# Altium integrated library chipfc_altium_libs.IntLib: 266 symbols (part 3 of 3)
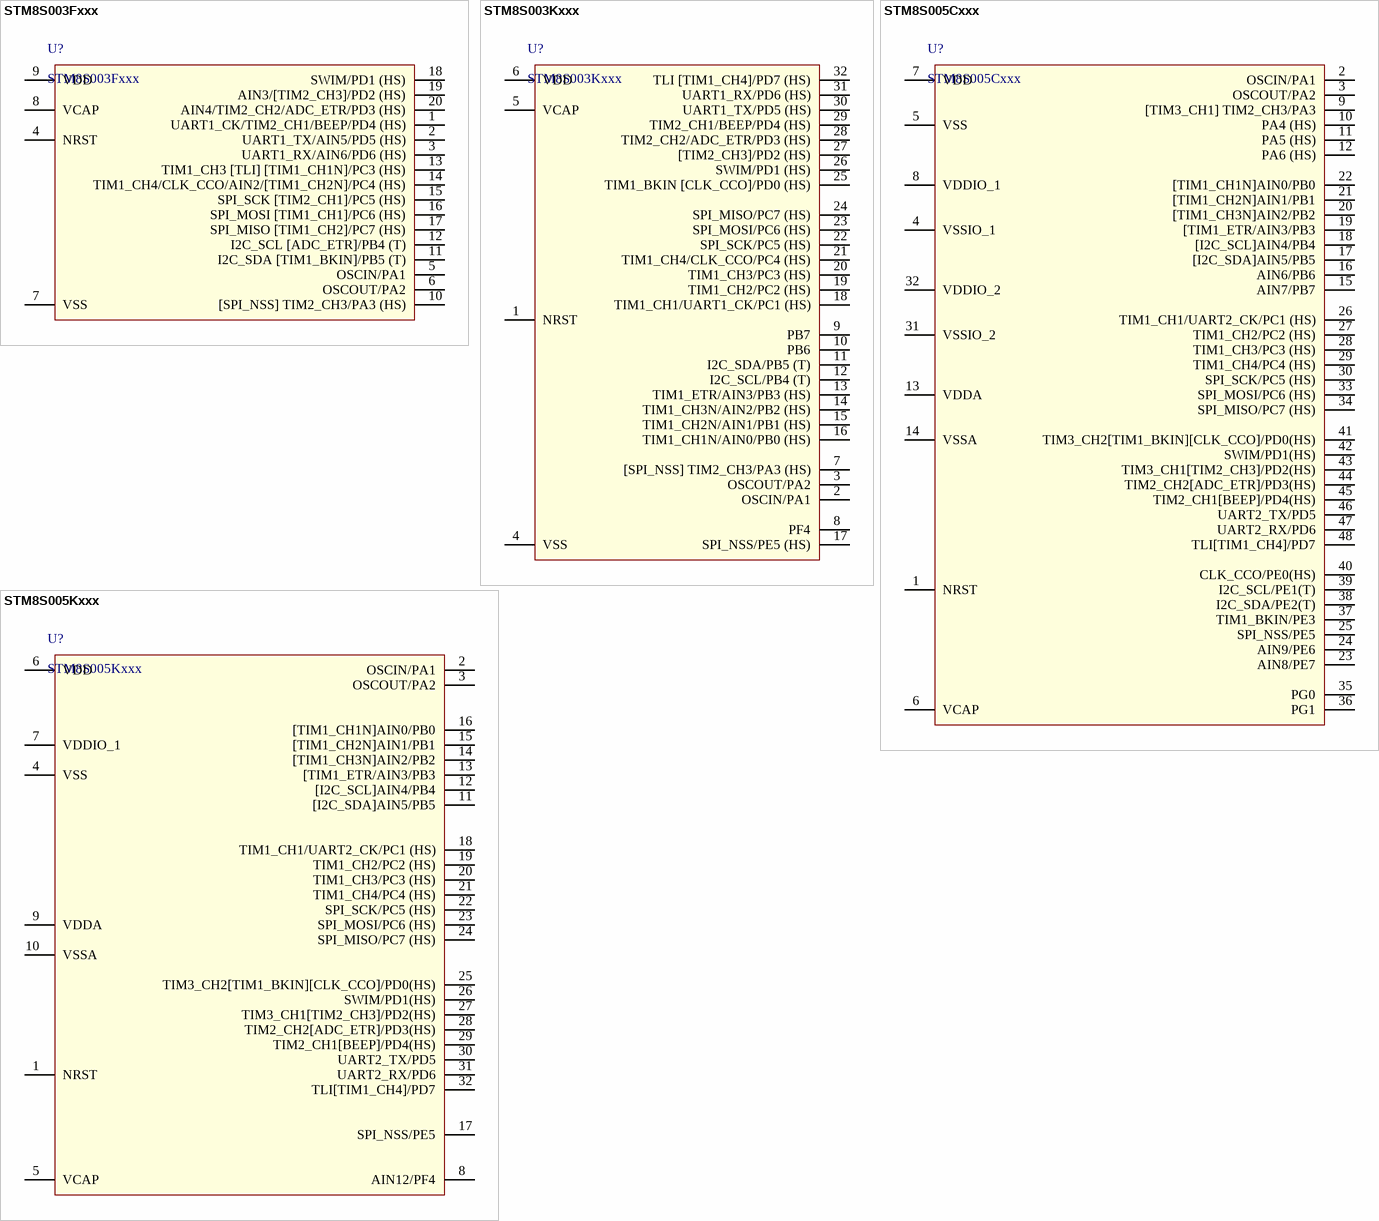
[diagram p17: symbols STM8S003Fxxx to STM8S005Kxxx]

## STM8S005Cxxx
designator U?
Value line, 16 MHz STM8S 8-bit MCU, 32 Kbytes Flash, data  EEPROM,10-bit ADC, timers, UART, SPI, I²C
footprint ST/QFP/50P/48 (TSQFP, 48-Leads, Body 9.2x9.2mm (max), Pitch 0.50mm, IPC Medium Density)
pins: 1 NRST, 2 OSCIN/PA1, 3 OSCOUT/PA2, 4 VSSIO_1, 5 VSS, 6 VCAP, 7 VDD, 8 VDDIO_1, 9 [TIM3_CH1] TIM2_CH3/PA3, 10 PA4 (HS), 11 PA5 (HS), 12 PA6 (HS), 13 VDDA, 14 VSSA, 15 AIN7/PB7, 16 AIN6/PB6, 17 [I2C_SDA]AIN5/PB5, 18 [I2C_SCL]AIN4/PB4, 19 [TIM1_ETR/AIN3/PB3, 20 [TIM1_CH3N]AIN2/PB2, 21 [TIM1_CH2N]AIN1/PB1, 22 [TIM1_CH1N]AIN0/PB0, 23 AIN8/PE7, 24 AIN9/PE6, 25 SPI_NSS/PE5, 26 TIM1_CH1/UART2_CK/PC1 (HS), 27 TIM1_CH2/PC2 (HS), 28 TIM1_CH3/PC3 (HS), 29 TIM1_CH4/PC4 (HS), 30 SPI_SCK/PC5 (HS), 31 VSSIO_2, 32 VDDIO_2, 33 SPI_MOSI/PC6 (HS), 34 SPI_MISO/PC7 (HS), 35 PG0, 36 PG1, 37 TIM1_BKIN/PE3, 38 I2C_SDA/PE2(T), 39 I2C_SCL/PE1(T), 40 CLK_CCO/PE0(HS), 41 TIM3_CH2[TIM1_BKIN][CLK_CCO]/PD0(HS), 42 SWIM/PD1(HS), 43 TIM3_CH1[TIM2_CH3]/PD2(HS), 44 TIM2_CH2[ADC_ETR]/PD3(HS), 45 TIM2_CH1[BEEP]/PD4(HS), 46 UART2_TX/PD5, 47 UART2_RX/PD6, 48 TLI[TIM1_CH4]/PD7

## STM8S005Kxxx
designator U?
Value line, 16 MHz STM8S 8-bit MCU, 32 Kbytes Flash, data  EEPROM,10-bit ADC, timers, UART, SPI, I²C
footprint ST/QFP/80P/32 (TQFP, 32-Leads, Body 9.0x9.0mm (max), Pitch 0.80mm, IPC Medium Density)
pins: 1 NRST, 2 OSCIN/PA1, 3 OSCOUT/PA2, 4 VSS, 5 VCAP, 6 VDD, 7 VDDIO_1, 8 AIN12/PF4, 9 VDDA, 10 VSSA, 11 [I2C_SDA]AIN5/PB5, 12 [I2C_SCL]AIN4/PB4, 13 [TIM1_ETR/AIN3/PB3, 14 [TIM1_CH3N]AIN2/PB2, 15 [TIM1_CH2N]AIN1/PB1, 16 [TIM1_CH1N]AIN0/PB0, 17 SPI_NSS/PE5, 18 TIM1_CH1/UART2_CK/PC1 (HS), 19 TIM1_CH2/PC2 (HS), 20 TIM1_CH3/PC3 (HS), 21 TIM1_CH4/PC4 (HS), 22 SPI_SCK/PC5 (HS), 23 SPI_MOSI/PC6 (HS), 24 SPI_MISO/PC7 (HS), 25 TIM3_CH2[TIM1_BKIN][CLK_CCO]/PD0(HS), 26 SWIM/PD1(HS), 27 TIM3_CH1[TIM2_CH3]/PD2(HS), 28 TIM2_CH2[ADC_ETR]/PD3(HS), 29 TIM2_CH1[BEEP]/PD4(HS), 30 UART2_TX/PD5, 31 UART2_RX/PD6, 32 TLI[TIM1_CH4]/PD7


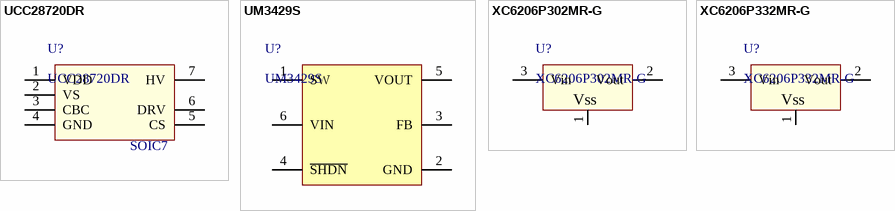
[diagram p15: symbols UCC28720DR to XC6206P332MR-G]

## UCC28720DR
designator U?  PACKAGE: SOIC7
Converter Offline Flyback Topology 650Hz ~ 80kHz 7-SOIC; BRAND: TI; PART NO: UCC28720DR; STOCK CODE: 296-41058-1-ND; SUPPLIER: Digi-Key; TYPE: SMD
footprint SOIC-7 (SOIC, 8-Leads, Body 5.0x4.0mm (max), Pitch 1.27mm, IPC Medium Density)
pins: 1 VDD "VDD is the bias supply input pin to the controller. A carefully-placed bypass capacitor to GND is required on this pin.", 2 VS "Voltage sense is an input used to provide voltage and timing feedback to the controller.", 3 CBC "Cable compensation is a programming pin for compensation of cable voltage drop. Cable compensation is programmed with a resistor to GND.", 4 GND "The ground pin is both the reference pin for the controller and the low-side return for the drive output.", 5 CS "Current sense input connects to a ground-referenced current-sense resistor in series with the power switch.", 6 DRV "Drive is an output used to drive the base of an external high voltage NPN transistor.", 7 HV "The high-voltage pin connects directly to the rectified bulk voltage and provides charge to the VDD capacitor for start-up of the power supply."

## UM3429S
designator U?
600mA, 1MHz, Synchronous Step-Up DC-DC Converter; BRAND: UNION; PACKAGE: SOT23-6; PART NO: UM3429S; TYPE: SMD
footprint SOT-23-6/UM3429S (SOT23, 6-Leads, Body 3.0x3.0mm (max), Pitch 0.95mm, IPC Medium Density)
pins: 1 SW "Switch Pin", 2 GND "Ground", 3 FB "Feedback Input Pin.", 4 ~{SHDN} "Logic Controlled Shutdown Input", 5 VOUT "Output Voltage Sense Input and Drain of the Internal", 6 VIN "Battery Input Voltage"

## XC6206P302MR-G
designator U?
LDO Voltage Regulators 1uA Low Quiescent 3 Terminal, Low ESR Cap. Compatible, Voltage Regulator; Manufacturer: Torex Semiconductor; Input Voltage MAX: 6 V; Number of Outputs: 1 Output; Output Current: 200 mA; Output Type: Fixed; Output Voltage: 3 V; Voltage Regulation Accuracy: 2 %; Dropout Voltage: 250 mV; Input Voltage MIN: 1.8 V; Line Regulation: 0.05 %/V; Load Regulation: 60 mV; Pd - Power Dissipation: 250 mW; Supplier 1: Mouser; Supplier Part Number 1: 865-XC6206P302MR-G; Manufacturer Part Number: XC6206P302MR-G; RoHS: RoHS Compliant; Category: LDO Voltage Regulators; Stock 1: 5316; Pricing 1: 1=0.670, 10=0.520, 100=0.394, 500=0.336, 1000=0.269, 3000=0.236, 9000=0.212, 24000=0.209, 45000=0.202 (USD); Package: SOT-23-3; Packaging: Cut Tape; Product: Voltage Regulators; Quiescent Current: 1 uA; Type: Positive Voltage Regulator; Brand: Torex Semiconductor; Mounting Style: SMD/SMT; Output Voltage Range: -; Maximum Operating Temperature: + 85 C; Minimum Operating Temperature: - 40 C; Operating Supply Current: 1 uA; Product Type: LDO Voltage Regulators; Standard Pack Qty: 3000; Subcategory: PMIC - Power Management ICs; RoHS - Mouser: Y; Minimum Order Quantity: 1; Reeling: True
footprint SOT-23 (SOT23, 3-Leads, Body 3.0x2.5mm (max), Pitch 0.95mm, IPC Medium Density)
pins: 1 VSS, 2 Vout, 3 Vin (power)
text: Vss

## XC6206P332MR-G
designator U?
LDO Voltage Regulators 1uA Low Quiescent 3 Terminal, Low ESR Cap. Compatible, Voltage Regulator; Manufacturer: Torex Semiconductor; Input Voltage MAX: 6 V; Number of Outputs: 1 Output; Output Current: 200 mA; Output Type: Fixed; Output Voltage: 3.3 V; Voltage Regulation Accuracy: 2 %; Dropout Voltage: 250 mV; Input Voltage MIN: 1.8 V; Line Regulation: 0.05 %/V; Load Regulation: 60 mV; Pd - Power Dissipation: 250 mW; Supplier 1: Mouser; Supplier Part Number 1: 865-XC6206P332MR-G; Manufacturer Part Number: XC6206P332MR-G; RoHS: RoHS Compliant; Category: LDO Voltage Regulators; Stock 1: 4719; Pricing 1: 1=0.670, 10=0.520, 100=0.394, 500=0.336, 1000=0.269, 3000=0.236, 9000=0.212, 24000=0.209, 45000=0.202 (USD); Package: SOT-23-3; Packaging: Cut Tape; Product: Voltage Regulators; Quiescent Current: 1 uA; Type: Positive Voltage Regulator; Brand: Torex Semiconductor; Mounting Style: SMD/SMT; Output Voltage Range: -; Maximum Operating Temperature: + 85 C; Minimum Operating Temperature: - 40 C; Operating Supply Current: 1 uA; Product Type: LDO Voltage Regulators; Standard Pack Qty: 3000; Subcategory: PMIC - Power Management ICs; RoHS - Mouser: Y; Minimum Order Quantity: 1; Reeling: True
footprint SOT-23
pins: 1 VSS, 2 Vout, 3 Vin (power)
text: Vss